# Altium footprint library Metric_SMD.PcbLib: 185 footprints (part 5 of 12)
Each footprint in its own frame and in the unit in brackets; x right, y up, seen from the top. Pads: shape width x height; smd on the part's side, far side on the other; paste and mask are expansions set on the pad; w line width, h text height; cw(c..) or ccw(c..) is an arc to the next point about the centre after c.
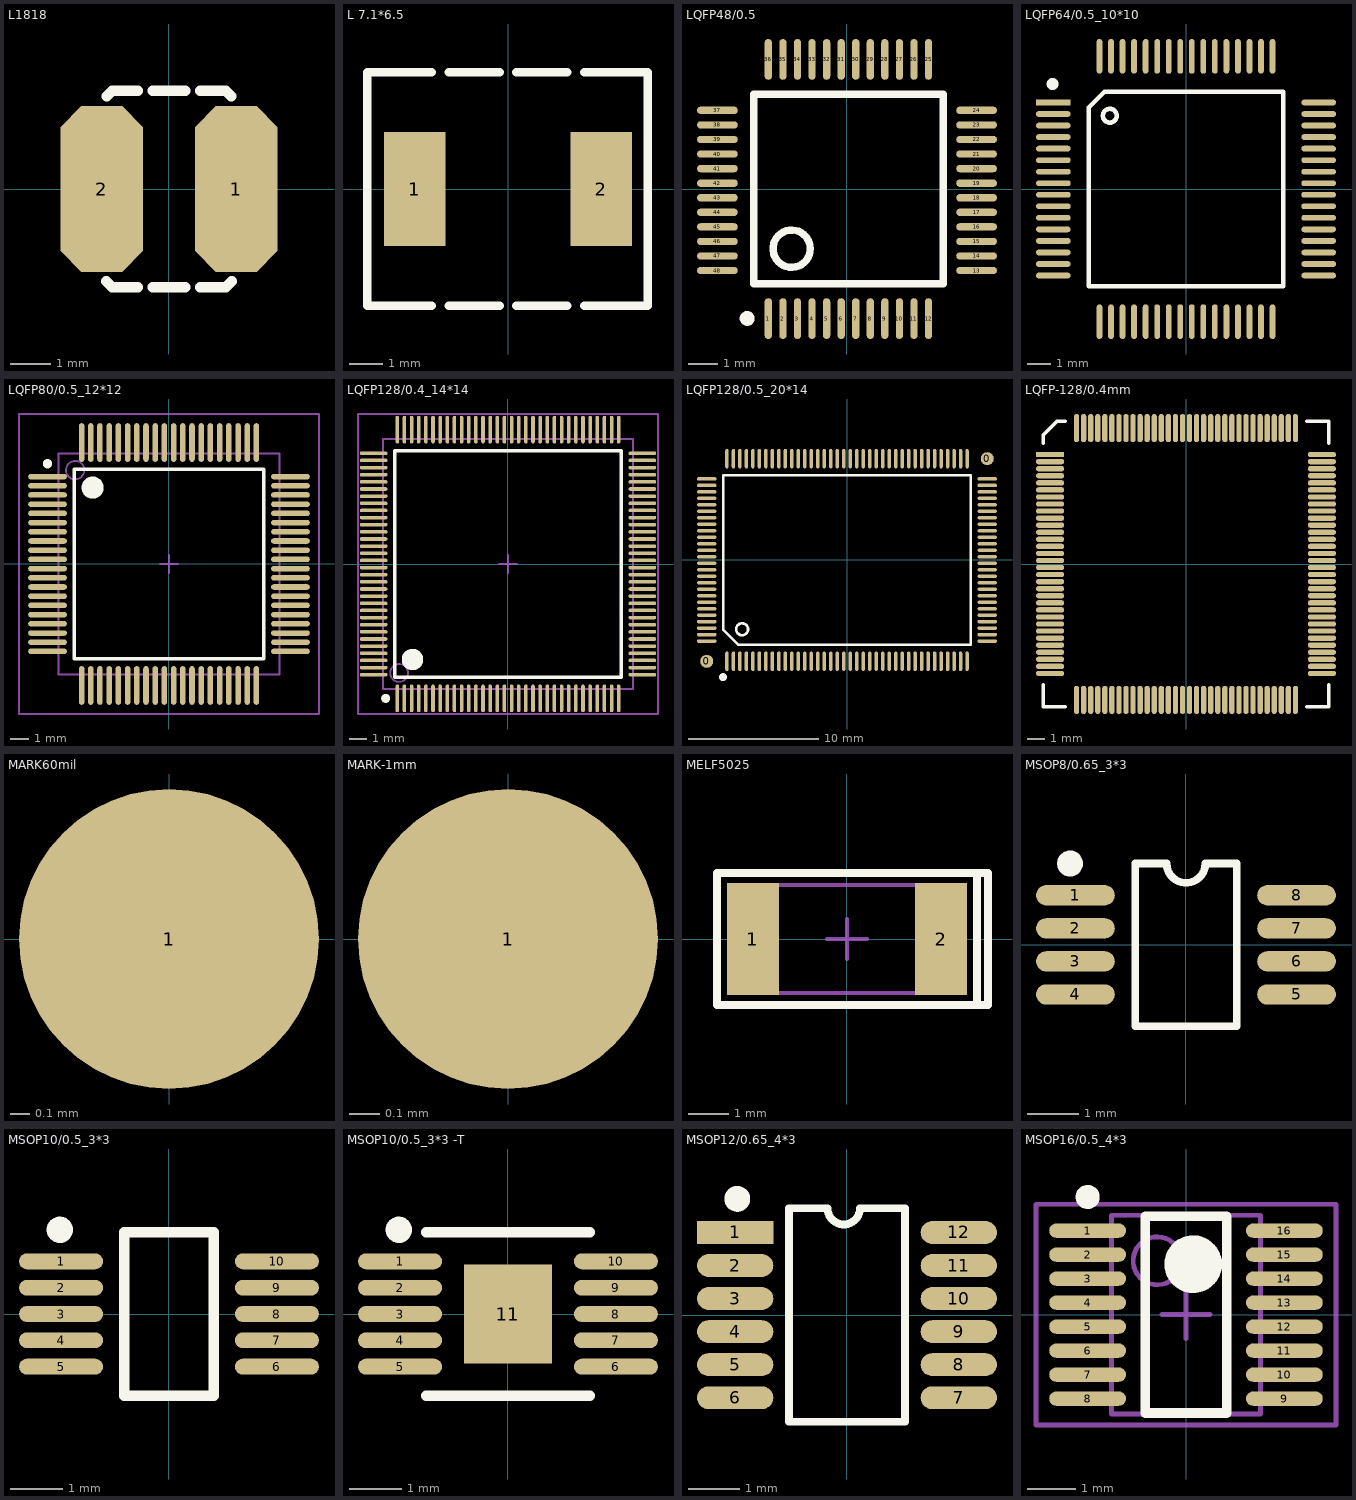
[diagram p4: the footprints below, top view; thin cyan lines are the x and y axes]

## L1818 [mil] "磁心圆柱功率电感"
height 236.22
pads (2):
  oct 80x160 smd: 1(65,0) 2(-65,0)
Top Overlay:
  lines w10: -60.69,-89.31 -55,-95 -30,-95 ; -60.24,89.76 -55,95 -30,95 ; -15.75,-95 15.75,-95 ; -15.75,95 15.75,95 ; 30,-95 55,-95 60.77,-89.23 ; 30,95 55,95 60.24,89.76

## L 7.1*6.5 [mm]
pads (2):
  rect 1.85x3.4 smd: 1(-2.788,0) 2(2.788,0)
Top Overlay:
  lines w0.254: -2.286,-3.5 -3.913,-3.5 -4.213,-3.5 -4.213,3.5 -3.913,3.5 -2.286,3.5 ; -1.778,-3.5 -0.254,-3.5 ; -1.778,3.5 -0.254,3.5 ; 0.254,-3.5 1.778,-3.5 ; 0.254,3.5 1.778,3.5 ; 2.286,-3.5 3.812,-3.5 4.187,-3.5 4.187,3.5 3.912,3.5 2.286,3.5
3D body: height 3, standoff 0, extent -3.385,-3.491 3.321,3.291

## LQFP48/0.5 [mm] "0.5mm间距"
height 1.5
pads (48):
  oval 0.25x1.4 smd: 1(-2.7,-4.45) 2(-2.2,-4.45) 3(-1.7,-4.45) 4(-1.2,-4.45) 5(-0.7,-4.45) 6(-0.2,-4.45) 7(0.3,-4.45) 8(0.8,-4.45) 9(1.3,-4.45) 10(1.8,-4.45) 11(2.3,-4.45) 12(2.8,-4.45) 25(2.8,4.45) 26(2.3,4.45) 27(1.8,4.45) 28(1.3,4.45) 29(0.8,4.45) 30(0.3,4.45) 31(-0.2,4.45) 32(-0.7,4.45) 33(-1.2,4.45) 34(-1.7,4.45) 35(-2.2,4.45) 36(-2.7,4.45)
  oval 1.4x0.25 smd: 13(4.45,-2.8) 14(4.45,-2.3) 15(4.45,-1.8) 16(4.45,-1.3) 17(4.45,-0.8) 18(4.45,-0.3) 19(4.45,0.2) 20(4.45,0.7) 21(4.45,1.2) 22(4.45,1.7) 23(4.45,2.2) 24(4.45,2.7) 37(-4.45,2.7) 38(-4.45,2.2) 39(-4.45,1.7) 40(-4.45,1.2) 41(-4.45,0.7) 42(-4.45,0.2) 43(-4.45,-0.3) 44(-4.45,-0.8) 45(-4.45,-1.3) 46(-4.45,-1.8) 47(-4.45,-2.3) 48(-4.45,-2.8)
Top Overlay:
  circle w0.254: c-1.9,-2.05 r0.64
  circle w0.254: c-3.429,-4.445 r0.127
  lines w0.254: -3.2,-3.25 -3.2,3.25 3.3,3.25 3.3,-3.25 -3.2,-3.25
3D body: height 0.8, standoff 0, extent -3.6,-3.55 3.6,3.55

## LQFP64/0.5_10*10 [mm] "AT91SAM7S64使用  64引脚"
height 1.6
pads (64):
  rect 1.5x0.25 smd: 1(-5.75,3.75)
  oval 1.5x0.25 smd: 2(-5.75,3.25) 3(-5.75,2.75) 4(-5.75,2.25) 5(-5.75,1.75) 6(-5.75,1.25) 7(-5.75,0.75) 8(-5.75,0.25) 9(-5.75,-0.25) 10(-5.75,-0.75) 11(-5.75,-1.25) 12(-5.75,-1.75) 13(-5.75,-2.25) 14(-5.75,-2.75) 15(-5.75,-3.25) 16(-5.75,-3.75) 33(5.75,-3.75) 34(5.75,-3.25) 35(5.75,-2.75) 36(5.75,-2.25) 37(5.75,-1.75) 38(5.75,-1.25) 39(5.75,-0.75) 40(5.75,-0.25) 41(5.75,0.25) 42(5.75,0.75) 43(5.75,1.25) 44(5.75,1.75) 45(5.75,2.25) 46(5.75,2.75) 47(5.75,3.25) 48(5.75,3.75)
  oval 0.25x1.5 smd: 17(-3.75,-5.75) 18(-3.25,-5.75) 19(-2.75,-5.75) 20(-2.25,-5.75) 21(-1.75,-5.75) 22(-1.25,-5.75) 23(-0.75,-5.75) 24(-0.25,-5.75) 25(0.25,-5.75) 26(0.75,-5.75) 27(1.25,-5.75) 28(1.75,-5.75) 29(2.25,-5.75) 30(2.75,-5.75) 31(3.25,-5.75) 32(3.75,-5.75) 49(3.75,5.75) 50(3.25,5.75) 51(2.75,5.75) 52(2.25,5.75) 53(1.75,5.75) 54(1.25,5.75) 55(0.75,5.75) 56(0.25,5.75) 57(-0.25,5.75) 58(-0.75,5.75) 59(-1.25,5.75) 60(-1.75,5.75) 61(-2.25,5.75) 62(-2.75,5.75) 63(-3.25,5.75) 64(-3.75,5.75)
Top Overlay:
  circle w0.2: c-3.302,3.175 r0.3
  circle w0.25: c-5.78,4.55 r0.13
  lines w0.2: -4.215,-4.215 -4.215,3.532 -3.532,4.215 4.215,4.215 4.215,-4.215 -4.215,-4.215
3D body "User Library-LQFP-64.STEP": height 1.7, standoff -0.01, extent -6,-6 6,6

## LQFP80/0.5_12*12 [mm] "Shrink QFP, 80-Leads, Body 12x12mm, Pitch 0.5mm, IPC Low Density"
height 2.2
pads (80):
  oval 2.1x0.3 smd: 1(-6.6,4.75) 2(-6.6,4.25) 3(-6.6,3.75) 4(-6.6,3.25) 5(-6.6,2.75) 6(-6.6,2.25) 7(-6.6,1.75) 8(-6.6,1.25) 9(-6.6,0.75) 10(-6.6,0.25) 11(-6.6,-0.25) 12(-6.6,-0.75) 13(-6.6,-1.25) 14(-6.6,-1.75) 15(-6.6,-2.25) 16(-6.6,-2.75) 17(-6.6,-3.25) 18(-6.6,-3.75) 19(-6.6,-4.25) 20(-6.6,-4.75) 41(6.6,-4.75) 42(6.6,-4.25) 43(6.6,-3.75) 44(6.6,-3.25) 45(6.6,-2.75) 46(6.6,-2.25) 47(6.6,-1.75) 48(6.6,-1.25) 49(6.6,-0.75) 50(6.6,-0.25) 51(6.6,0.25) 52(6.6,0.75) 53(6.6,1.25) 54(6.6,1.75) 55(6.6,2.25) 56(6.6,2.75) 57(6.6,3.25) 58(6.6,3.75) 59(6.6,4.25) 60(6.6,4.75)
  oval 0.3x2.1 smd: 21(-4.75,-6.6) 22(-4.25,-6.6) 23(-3.75,-6.6) 24(-3.25,-6.6) 25(-2.75,-6.6) 26(-2.25,-6.6) 27(-1.75,-6.6) 28(-1.25,-6.6) 29(-0.75,-6.6) 30(-0.25,-6.6) 31(0.25,-6.6) 32(0.75,-6.6) 33(1.25,-6.6) 34(1.75,-6.6) 35(2.25,-6.6) 36(2.75,-6.6) 37(3.25,-6.6) 38(3.75,-6.6) 39(4.25,-6.6) 40(4.75,-6.6) 61(4.75,6.6) 62(4.25,6.6) 63(3.75,6.6) 64(3.25,6.6) 65(2.75,6.6) 66(2.25,6.6) 67(1.75,6.6) 68(1.25,6.6) 69(0.75,6.6) 70(0.25,6.6) 71(-0.25,6.6) 72(-0.75,6.6) 73(-1.25,6.6) 74(-1.75,6.6) 75(-2.25,6.6) 76(-2.75,6.6) 77(-3.25,6.6) 78(-3.75,6.6) 79(-4.25,6.6) 80(-4.75,6.6)
Top Overlay:
  circle w0.25: c-6.6,5.45 r0.13
  circle w0.6: c-4.15,4.15 r0.3
  lines w0.2: -5.15,-5.15 -5.15,5.15 5.15,5.15 5.15,-5.15 -5.15,-5.15
Mechanical 13:
  circle w0.1: c-5.1,5.1 r0.5
  lines w0.1: -6,-6 -6,6 6,6 6,-6 -6,-6
Mechanical 15:
  lines w0.1: -0.5,0 0.5,0 ; 0,-0.5 0,0.5 ; -8.15,-8.15 -8.15,8.15 8.15,8.15 8.15,-8.15 -8.15,-8.15
3D body: height 2.2, standoff 0, extent -6,-6 6,6

## LQFP128/0.4_14*14 [mm] "Shrink QFP, 128-Leads, Body 14x14mm, Pitch 0.4mm, IPC High Density"
height 2.2
pads (128):
  oval 0.2x1.55 smd: 1(-6.2,-7.525) 2(-5.8,-7.525) 3(-5.4,-7.525) 4(-5,-7.525) 5(-4.6,-7.525) 6(-4.2,-7.525) 7(-3.8,-7.525) 8(-3.4,-7.525) 9(-3,-7.525) 10(-2.6,-7.525) 11(-2.2,-7.525) 12(-1.8,-7.525) 13(-1.4,-7.525) 14(-1,-7.525) 15(-0.6,-7.525) 16(-0.2,-7.525) 17(0.2,-7.525) 18(0.6,-7.525) 19(1,-7.525) 20(1.4,-7.525) 21(1.8,-7.525) 22(2.2,-7.525) 23(2.6,-7.525) 24(3,-7.525) 25(3.4,-7.525) 26(3.8,-7.525) 27(4.2,-7.525) 28(4.6,-7.525) 29(5,-7.525) 30(5.4,-7.525) 31(5.8,-7.525) 32(6.2,-7.525) 65(6.2,7.525) 66(5.8,7.525) 67(5.4,7.525) 68(5,7.525) 69(4.6,7.525) 70(4.2,7.525) 71(3.8,7.525) 72(3.4,7.525) 73(3,7.525) 74(2.6,7.525) 75(2.2,7.525) 76(1.8,7.525) 77(1.4,7.525) 78(1,7.525) 79(0.6,7.525) 80(0.2,7.525) 81(-0.2,7.525) 82(-0.6,7.525) 83(-1,7.525) 84(-1.4,7.525) 85(-1.8,7.525) 86(-2.2,7.525) 87(-2.6,7.525) 88(-3,7.525) 89(-3.4,7.525) 90(-3.8,7.525) 91(-4.2,7.525) 92(-4.6,7.525) 93(-5,7.525) 94(-5.4,7.525) 95(-5.8,7.525) 96(-6.2,7.525)
  oval 1.55x0.2 smd: 33(7.525,-6.2) 34(7.525,-5.8) 35(7.525,-5.4) 36(7.525,-5) 37(7.525,-4.6) 38(7.525,-4.2) 39(7.525,-3.8) 40(7.525,-3.4) 41(7.525,-3) 42(7.525,-2.6) 43(7.525,-2.2) 44(7.525,-1.8) 45(7.525,-1.4) 46(7.525,-1) 47(7.525,-0.6) 48(7.525,-0.2) 49(7.525,0.2) 50(7.525,0.6) 51(7.525,1) 52(7.525,1.4) 53(7.525,1.8) 54(7.525,2.2) 55(7.525,2.6) 56(7.525,3) 57(7.525,3.4) 58(7.525,3.8) 59(7.525,4.2) 60(7.525,4.6) 61(7.525,5) 62(7.525,5.4) 63(7.525,5.8) 64(7.525,6.2) 97(-7.525,6.2) 98(-7.525,5.8) 99(-7.525,5.4) 100(-7.525,5) 101(-7.525,4.6) 102(-7.525,4.2) 103(-7.525,3.8) 104(-7.525,3.4) 105(-7.525,3) 106(-7.525,2.6) 107(-7.525,2.2) 108(-7.525,1.8) 109(-7.525,1.4) 110(-7.525,1) 111(-7.525,0.6) 112(-7.525,0.2) 113(-7.525,-0.2) 114(-7.525,-0.6) 115(-7.525,-1) 116(-7.525,-1.4) 117(-7.525,-1.8) 118(-7.525,-2.2) 119(-7.525,-2.6) 120(-7.525,-3) 121(-7.525,-3.4) 122(-7.525,-3.8) 123(-7.525,-4.2) 124(-7.525,-4.6) 125(-7.525,-5) 126(-7.525,-5.4) 127(-7.525,-5.8) 128(-7.525,-6.2)
Top Overlay:
  circle w0.25: c-6.85,-7.525 r0.125
  circle w0.6: c-5.35,-5.35 r0.3
  lines w0.2: -6.35,-6.35 6.35,-6.35 6.35,6.35 -6.35,6.35 -6.35,-6.35
Mechanical 13:
  circle w0.1: c-6.1,-6.1 r0.5
  lines w0.1: -7,-7 7,-7 7,7 -7,7 -7,-7
Mechanical 15:
  lines w0.1: -0.5,0 0.5,0 ; 0,-0.5 0,0.5 ; -8.4,-8.4 8.4,-8.4 8.4,8.4 -8.4,8.4 -8.4,-8.4
3D body: height 0.8, standoff 0, extent -7,-7 7,7

## LQFP128/0.5_20*14 [mm]
height 1.6
pads (130):
  round 1 smd mask+0.5: 0(-10.8,-7.8) 0(10.8,7.8)
  oval 0.25x1.5 smd: 1(-9.25,-7.8) 2(-8.75,-7.8) 3(-8.25,-7.8) 4(-7.75,-7.8) 5(-7.25,-7.8) 6(-6.75,-7.8) 7(-6.25,-7.8) 8(-5.75,-7.8) 9(-5.25,-7.8) 10(-4.75,-7.8) 11(-4.25,-7.8) 12(-3.75,-7.8) 13(-3.25,-7.8) 14(-2.75,-7.8) 15(-2.25,-7.8) 16(-1.75,-7.8) 17(-1.25,-7.8) 18(-0.75,-7.8) 19(-0.25,-7.8) 20(0.25,-7.8) 21(0.75,-7.8) 22(1.25,-7.8) 23(1.75,-7.8) 24(2.25,-7.8) 25(2.75,-7.8) 26(3.25,-7.8) 27(3.75,-7.8) 28(4.25,-7.8) 29(4.75,-7.8) 30(5.25,-7.8) 31(5.75,-7.8) 32(6.25,-7.8) 33(6.75,-7.8) 34(7.25,-7.8) 35(7.75,-7.8) 36(8.25,-7.8) 37(8.75,-7.8) 38(9.25,-7.8) 65(9.25,7.8) 66(8.75,7.8) 67(8.25,7.8) 68(7.75,7.8) 69(7.25,7.8) 70(6.75,7.8) 71(6.25,7.8) 72(5.75,7.8) 73(5.25,7.8) 74(4.75,7.8) 75(4.25,7.8) 76(3.75,7.8) 77(3.25,7.8) 78(2.75,7.8) 79(2.25,7.8) 80(1.75,7.8) 81(1.25,7.8) 82(0.75,7.8) 83(0.25,7.8) 84(-0.25,7.8) 85(-0.75,7.8) 86(-1.25,7.8) 87(-1.75,7.8) 88(-2.25,7.8) 89(-2.75,7.8) 90(-3.25,7.8) 91(-3.75,7.8) 92(-4.25,7.8) 93(-4.75,7.8) 94(-5.25,7.8) 95(-5.75,7.8) 96(-6.25,7.8) 97(-6.75,7.8) 98(-7.25,7.8) 99(-7.75,7.8) 100(-8.25,7.8) 101(-8.75,7.8) 102(-9.25,7.8)
  oval 1.5x0.25 smd: 39(10.8,-6.25) 40(10.8,-5.75) 41(10.8,-5.25) 42(10.8,-4.75) 43(10.8,-4.25) 44(10.8,-3.75) 45(10.8,-3.25) 46(10.8,-2.75) 47(10.8,-2.25) 48(10.8,-1.75) 49(10.8,-1.25) 50(10.8,-0.75) 51(10.8,-0.25) 52(10.8,0.25) 53(10.8,0.75) 54(10.8,1.25) 55(10.8,1.75) 56(10.8,2.25) 57(10.8,2.75) 58(10.8,3.25) 59(10.8,3.75) 60(10.8,4.25) 61(10.8,4.75) 62(10.8,5.25) 63(10.8,5.75) 64(10.8,6.25) 103(-10.8,6.25) 104(-10.8,5.75) 105(-10.8,5.25) 106(-10.8,4.75) 107(-10.8,4.25) 108(-10.8,3.75) 109(-10.8,3.25) 110(-10.8,2.75) 111(-10.8,2.25) 112(-10.8,1.75) 113(-10.8,1.25) 114(-10.8,0.75) 115(-10.8,0.25) 116(-10.8,-0.25) 117(-10.8,-0.75) 118(-10.8,-1.25) 119(-10.8,-1.75) 120(-10.8,-2.25) 121(-10.8,-2.75) 122(-10.8,-3.25) 123(-10.8,-3.75) 124(-10.8,-4.25) 125(-10.8,-4.75) 126(-10.8,-5.25) 127(-10.8,-5.75) 128(-10.8,-6.25)
Top Overlay:
  circle w0.2: c-8.078,-5.334 r0.458
  circle w0.3: c-9.548,-9.017 r0.15
  lines w0.2: -9.515,-5.382 -9.515,6.515 9.515,6.515 9.515,-6.515 -8.382,-6.515 -9.515,-5.382

## LQFP-128/0.4mm [mm] "14x14mm, LQFP-128，间距0.4mm"
height 2
pads (128):
  rect 1.6x0.3 smd: 1(-7.7,6.2)
  oval 1.6x0.3 smd: 2(-7.7,5.8) 3(-7.7,5.4) 4(-7.7,5) 5(-7.7,4.6) 6(-7.7,4.2) 7(-7.7,3.8) 8(-7.7,3.4) 9(-7.7,3) 10(-7.7,2.6) 11(-7.7,2.2) 12(-7.7,1.8) 13(-7.7,1.4) 14(-7.7,1) 15(-7.7,0.6) 16(-7.7,0.2) 17(-7.7,-0.2) 18(-7.7,-0.6) 19(-7.7,-1) 20(-7.7,-1.4) 21(-7.7,-1.8) 22(-7.7,-2.2) 23(-7.7,-2.6) 24(-7.7,-3) 25(-7.7,-3.4) 26(-7.7,-3.8) 27(-7.7,-4.2) 28(-7.7,-4.6) 29(-7.7,-5) 30(-7.7,-5.4) 31(-7.7,-5.8) 32(-7.7,-6.2) 65(7.7,-6.2) 66(7.7,-5.8) 67(7.7,-5.4) 68(7.7,-5) 69(7.7,-4.6) 70(7.7,-4.2) 71(7.7,-3.8) 72(7.7,-3.4) 73(7.7,-3) 74(7.7,-2.6) 75(7.7,-2.2) 76(7.7,-1.8) 77(7.7,-1.4) 78(7.7,-1) 79(7.7,-0.6) 80(7.7,-0.2) 81(7.7,0.2) 82(7.7,0.6) 83(7.7,1) 84(7.7,1.4) 85(7.7,1.8) 86(7.7,2.2) 87(7.7,2.6) 88(7.7,3) 89(7.7,3.4) 90(7.7,3.8) 91(7.7,4.2) 92(7.7,4.6) 93(7.7,5) 94(7.7,5.4) 95(7.7,5.8) 96(7.7,6.2)
  oval 0.3x1.6 smd: 33(-6.2,-7.7) 34(-5.8,-7.7) 35(-5.4,-7.7) 36(-5,-7.7) 37(-4.6,-7.7) 38(-4.2,-7.7) 39(-3.8,-7.7) 40(-3.4,-7.7) 41(-3,-7.7) 42(-2.6,-7.7) 43(-2.2,-7.7) 44(-1.8,-7.7) 45(-1.4,-7.7) 46(-1,-7.7) 47(-0.6,-7.7) 48(-0.2,-7.7) 49(0.2,-7.7) 50(0.6,-7.7) 51(1,-7.7) 52(1.4,-7.7) 53(1.8,-7.7) 54(2.2,-7.7) 55(2.6,-7.7) 56(3,-7.7) 57(3.4,-7.7) 58(3.8,-7.7) 59(4.2,-7.7) 60(4.6,-7.7) 61(5,-7.7) 62(5.4,-7.7) 63(5.8,-7.7) 64(6.2,-7.7) 97(6.2,7.7) 98(5.8,7.7) 99(5.4,7.7) 100(5,7.7) 101(4.6,7.7) 102(4.2,7.7) 103(3.8,7.7) 104(3.4,7.7) 105(3,7.7) 106(2.6,7.7) 107(2.2,7.7) 108(1.8,7.7) 109(1.4,7.7) 110(1,7.7) 111(0.6,7.7) 112(0.2,7.7) 113(-0.2,7.7) 114(-0.6,7.7) 115(-1,7.7) 116(-1.4,7.7) 117(-1.8,7.7) 118(-2.2,7.7) 119(-2.6,7.7) 120(-3,7.7) 121(-3.4,7.7) 122(-3.8,7.7) 123(-4.2,7.7) 124(-4.6,7.7) 125(-5,7.7) 126(-5.4,7.7) 127(-5.8,7.7) 128(-6.2,7.7)
Top Overlay:
  lines w0.2: -8.1,-6.85 -8.1,-8.1 -6.85,-8.1 ; -8.1,6.85 -8.1,7.3 -7.3,8.1 -6.85,8.1 ; 6.85,-8.1 8.1,-8.1 8.1,-6.85 ; 6.85,8.1 8.1,8.1 8.1,6.85

## MARK60mil [mil]
pads (1):
  round 60 smd paste-60 mask+60: 1(0,0)

## MARK-1mm [mm]
pads (1):
  round 1 smd paste-1 mask+1: 1(0,0)

## MELF5025 [mm] "MELF Diode, 2-Leads, Body 5.0x2.5mm, IPC Medium Density"
height 2.7
pads (2):
  rect 1.3x2.8 smd: 1(-2.35,0) 2(2.35,0)
Top Overlay:
  lines w0.2: -3.25,-1.65 3.25,-1.65 3.25,1.65 ; -3.25,1.65 3.25,1.65 ; 3.531,-1.65 3.531,1.65 3.25,1.65
  lines w0.203: -3.25,-1.65 -3.25,1.65 ; 3.25,-1.65 3.53,-1.65
Mechanical 13:
  region: 2.6,1.35 1.901,1.35 1.901,-1.35 2.6,-1.35
  lines w0.1: -2.6,-1.35 -2.6,1.35 2.6,1.35 2.6,-1.35 -2.6,-1.35
Mechanical 15:
  lines w0.1: -0.5,0 0.5,0 ; 0,-0.5 0,0.5 ; -3.25,-1.65 -3.25,1.65 3.25,1.65 3.25,-1.65 -3.25,-1.65
3D body: height 2.7, standoff 0, extent -2.6,-1.35 2.6,1.35

## MSOP8/0.65_3*3 [mm] "MSOP,8 PIN,Pitch 0.65mm,Body 3mmX3mm"
height 1.1
pads (8):
  oval 1.55x0.4 smd: 1(-2.175,0.975) 2(-2.175,0.325) 3(-2.175,-0.325) 4(-2.175,-0.975) 5(2.175,-0.975) 6(2.175,-0.325) 7(2.175,0.325) 8(2.175,0.975)
Top Overlay:
  circle w0.25: c-2.28,1.6 r0.13
  lines w0.152: -1,-1.6 -1,1.6 -0.381,1.6 ccw(c0,1.6) 0.381,1.6 1,1.6 1,-1.6 -1,-1.6
3D body "User Library-EMSOP-8 Natl Semi MUY08A.STEP": height 1.04, standoff -0.06, extent -2.5,-1.5 2.5,1.5

## MSOP10/0.5_3*3 [mm] "MSOP,10 PIN,Pitch 0.5mm,Body 3mmX3mm"
height 1.1
pads (10):
  oval 1.6x0.3 smd: 1(-2.05,1) 2(-2.05,0.5) 3(-2.05,0) 4(-2.05,-0.5) 5(-2.05,-1) 6(2.05,-1) 7(2.05,-0.5) 8(2.05,0) 9(2.05,0.5) 10(2.05,1)
Top Overlay:
  circle w0.25: c-2.075,1.6 r0.125
  lines w0.2: -0.85,-1.55 -0.85,1.55 0.85,1.55 0.85,-1.55 -0.85,-1.55
3D body "User Library-msop-10.STEP": height 1.15, standoff 0, extent -2.45,-1.5 2.45,1.5

## MSOP10/0.5_3*3 -T [mm] "MSOP, Exposed Die Pad,10 PIN,Pitch 0.5mm,Body 3mmX3mm"
height 1.1
pads (11):
  oval 1.6x0.3 smd: 1(-2.05,1) 2(-2.05,0.5) 3(-2.05,0) 4(-2.05,-0.5) 5(-2.05,-1) 6(2.05,-1) 7(2.05,-0.5) 8(2.05,0) 9(2.05,0.5) 10(2.05,1)
  rect 1.68x1.88 smd: 11(0,0)
Top Overlay:
  circle w0.25: c-2.075,1.6 r0.125
  lines w0.2: -1.55,-1.55 1.55,-1.55 ; -1.55,1.55 1.55,1.55
3D body "User Library-msop-10.STEP": height 1.15, standoff 0, extent -2.45,-1.5 2.45,1.5

## MSOP12/0.65_4*3 [mm] "MSOP,8 PIN,Pitch 0.65mm,Body 4mmX3mm"
height 1.1
pads (12):
  rect 1.5x0.45 smd: 1(-2.2,1.625)
  oval 1.5x0.45 smd: 2(-2.2,0.975) 3(-2.2,0.325) 4(-2.2,-0.325) 5(-2.2,-0.975) 6(-2.2,-1.625) 7(2.2,-1.625) 8(2.2,-0.975) 9(2.2,-0.325) 10(2.2,0.325) 11(2.2,0.975) 12(2.2,1.625)
Top Overlay:
  circle w0.254: c-2.159,2.286 r0.127
  lines w0.152: -1.143,-2.1 -1.143,2.1 -0.381,2.1 ccw(c-0.063,2.1) 0.254,2.1 1.143,2.1 1.143,-2.1 -1.143,-2.1

## MSOP16/0.5_4*3 [mm] "TSSOP, 16-Leads, Body 4.1x3.1mm (max), Pitch 0.50mm, IPC Medium Density"
height 1.1
pads (16):
  oval 1.6x0.3 smd: 1(-2.05,1.75) 2(-2.05,1.25) 3(-2.05,0.75) 4(-2.05,0.25) 5(-2.05,-0.25) 6(-2.05,-0.75) 7(-2.05,-1.25) 8(-2.05,-1.75) 9(2.05,-1.75) 10(2.05,-1.25) 11(2.05,-0.75) 12(2.05,-0.25) 13(2.05,0.25) 14(2.05,0.75) 15(2.05,1.25) 16(2.05,1.75)
Top Overlay:
  circle w0.6: c0.15,1.05 r0.3
  circle w0.25: c-2.05,2.45 r0.125
  lines w0.2: -0.85,-2.05 0.85,-2.05 0.85,2.05 -0.85,2.05 -0.85,-2.05
Mechanical 13:
  circle w0.1: c-0.6,1.12 r0.5
  lines w0.1: -1.55,-2.07 1.55,-2.07 1.55,2.07 -1.55,2.07 -1.55,-2.07
Mechanical 15:
  lines w0.1: -0.5,0 0.5,0 ; 0,-0.5 0,0.5 ; -3.125,-2.3 3.125,-2.3 3.125,2.3 -3.125,2.3 -3.125,-2.3
3D body: height 1.1, standoff 0.05, extent -1.55,-2.07 1.55,2.07